# Altium footprint library AltiumDesignerLibraries.PcbLib: 313 footprints (part 7 of 20)
Each footprint in its own frame and in the unit in brackets; x right, y up, seen from the top. Pads: shape width x height; smd on the part's side, far side on the other; paste and mask are expansions set on the pad; w line width, h text height; cw(c..) or ccw(c..) is an arc to the next point about the centre after c.
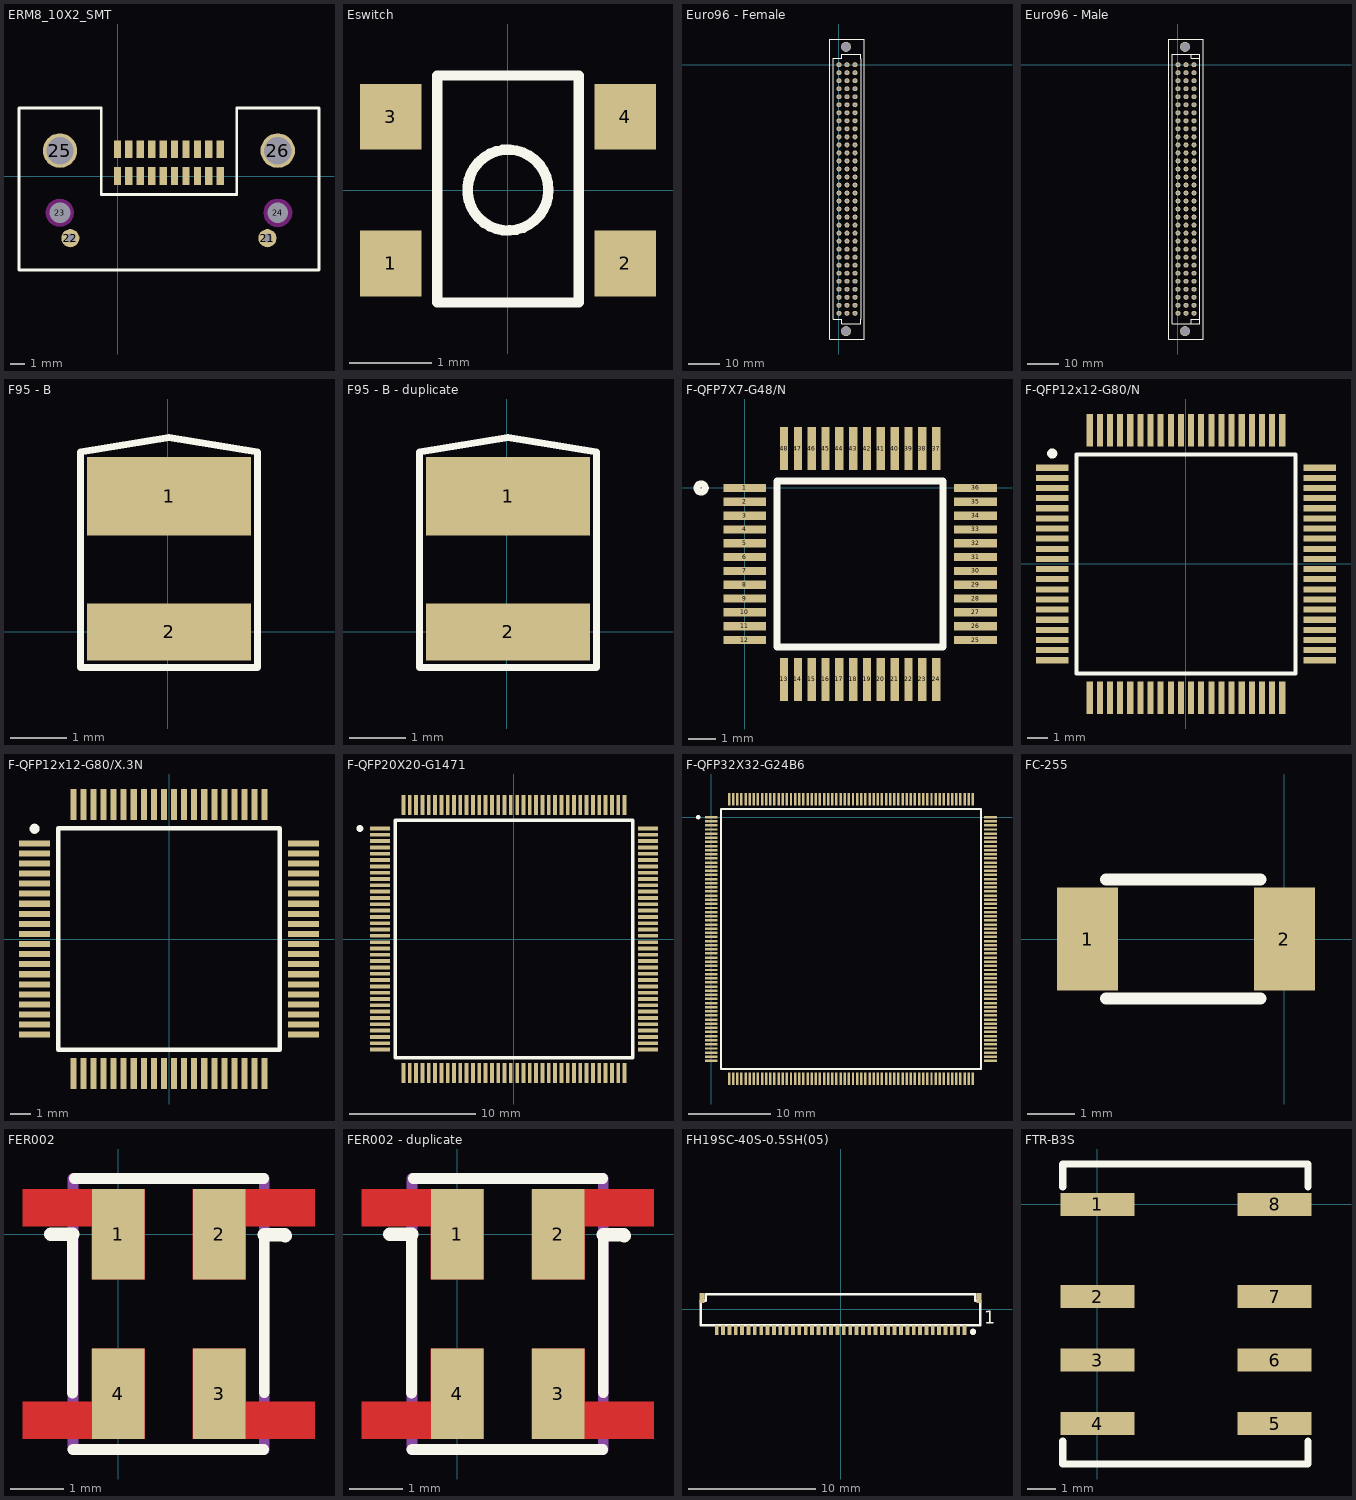
[diagram p6: the footprints below, top view; thin cyan lines are the x and y axes]

## ERM8_10X2_SMT [mil]
height 196.85
pads (26):
  rect 20x49 smd mask+3: 1(-0.99,0) 2(-0.99,74.02) 3(30.5,0) 4(30.5,74.02) 5(62,0) 6(62,74.02) 7(93.5,0) 8(93.5,74.02) 9(124.99,0) 10(124.99,74.02) 11(156.49,0) 12(156.49,74.02) 13(187.98,0) 14(187.98,74.02) 15(219.48,0) 16(219.48,74.02) 17(250.98,0) 18(250.98,74.02) 19(282.47,0) 20(282.47,74.02)
  round 50 hole 25 mask+3: 21(412.39,-171.46) 22(-130.91,-171.46)
  round 35 hole 57 unplated mask+15: 23(-159.46,-101.38) 24(440.94,-101.38)
  round 95 hole 75 mask+3: 25(-159.46,69.88) 26(440.94,69.88)
Top Overlay:
  lines w8: -272.45,-259.25 554.72,-259.25 554.72,187.6 327.94,187.6 327.94,-50.59 -45.68,-50.59 -45.68,187.6 -272.45,187.6 -272.45,-259.25
Keep-Out Layer:
  pour cut-out: 401.8,-101.44 403.14,-111.62 407.07,-121.11 413.32,-129.26 421.47,-135.51 430.95,-139.44 441.13,-140.78 451.31,-139.44 460.8,-135.51 468.95,-129.26 475.2,-121.11 479.13,-111.62 480.47,-101.44 479.13,-91.26 475.2,-81.77 468.95,-73.63 460.8,-67.37 451.31,-63.44 441.13,-62.1 430.95,-63.44 421.47,-67.37 413.32,-73.63 407.07,-81.77 403.14,-91.26
  pour cut-out: -198.21,-101.44 -196.9,-111.36 -193.07,-120.61 -186.98,-128.55 -179.04,-134.65 -169.79,-138.48 -159.87,-139.78 -149.94,-138.48 -140.7,-134.65 -132.75,-128.55 -126.66,-120.61 -122.83,-111.36 -121.53,-101.44 -122.83,-91.52 -126.66,-82.27 -132.75,-74.33 -140.7,-68.24 -149.94,-64.41 -159.87,-63.1 -169.79,-64.41 -179.04,-68.24 -186.98,-74.33 -193.07,-82.27 -196.9,-91.52

## Eswitch [mil]
height 62
pads (4):
  rect 29.5x31.5 smd: 1(-56.25,-35.25) 2(56.25,-35.25) 3(-56.25,35.25) 4(56.25,35.25)
Top Overlay:
  circle w5: c0,0 r19.42
  lines w5: -34,-54 -34,55 34,55 34,-54 -34,-54

## Euro96 - Female [mil]
pads (98):
  round 62 hole 38: A1(200,0) A2(200,-100) A3(200,-200) A4(200,-300) A5(200,-400) A6(200,-500) A7(200,-600) A8(200,-700) A9(200,-800) A10(200,-900) A11(200,-1000) A12(200,-1100) A13(200,-1200) A14(200,-1300) A15(200,-1400) A16(200,-1500) A17(200,-1600) A18(200,-1700) A19(200,-1800) A20(200,-1900) A21(200,-2000) A22(200,-2100) A23(200,-2200) A24(200,-2300) A25(200,-2400) A26(200,-2500) A27(200,-2600) A28(200,-2700) A29(200,-2800) A30(200,-2900) A31(200,-3000) A32(200,-3100) B1(100,0) B2(100,-100) B3(100,-200) B4(100,-300) B5(100,-400) B6(100,-500) B7(100,-600) B8(100,-700) B9(100,-800) B10(100,-900) B11(100,-1000) B12(100,-1100) B13(100,-1200) B14(100,-1300) B15(100,-1400) B16(100,-1500) B17(100,-1600) B18(100,-1700) B19(100,-1800) B20(100,-1900) B21(100,-2000) B22(100,-2100) B23(100,-2200) B24(100,-2300) B25(100,-2400) B26(100,-2500) B27(100,-2600) B28(100,-2700) B29(100,-2800) B30(100,-2900) B31(100,-3000) B32(100,-3100) C1(0,0) C2(0,-100) C3(0,-200) C4(0,-300) C5(0,-400) C6(0,-500) C7(0,-600) C8(0,-700) C9(0,-800) C10(0,-900) C11(0,-1000) C12(0,-1100) C13(0,-1200) C14(0,-1300) C15(0,-1400) C16(0,-1500) C17(0,-1600) C18(0,-1700) C19(0,-1800) C20(0,-1900) C21(0,-2000) C22(0,-2100) C23(0,-2200) C24(0,-2300) C25(0,-2400) C26(0,-2500) C27(0,-2600) C28(0,-2700) C29(0,-2800) C30(0,-2900) C31(0,-3000) C32(0,-3100)
  round 125 hole 110: ""(88,-3322) ""(88,222)
Top Overlay:
  lines w10: -72.54,-3172.47 32.46,-3172.47 ; -72,-3172.47 -72,77 33,77 33,128 33.94,128.94 166.34,128.94 271.34,128.94 271.65,128.62 271.65,76.77 272,-3173 272,-3228.98 ; 32.48,-3173.23 32.48,-3230.23 33.71,-3229 166,-3229 216,-3229 ; 213.58,-3229 271.98,-3229 ; 271.98,-3229 272,-3228.98 ; -118,-3420 -118,320 318,320 318,-3420 -118,-3420

## Euro96 - Male [mil]
pads (98):
  round 62 hole 39: A1(0,0) A2(0,-100) A3(0,-200) A4(0,-300) A5(0,-400) A6(0,-500) A7(0,-600) A8(0,-700) A9(0,-800) A10(0,-900) A11(0,-1000) A12(0,-1100) A13(0,-1200) A14(0,-1300) A15(0,-1400) A16(0,-1500) A17(0,-1600) A18(0,-1700) A19(0,-1800) A20(0,-1900) A21(0,-2000) A22(0,-2100) A23(0,-2200) A24(0,-2300) A25(0,-2400) A26(0,-2500) A27(0,-2600) A28(0,-2700) A29(0,-2800) A30(0,-2900) A31(0,-3000) A32(0,-3100) B1(100,0) B2(100,-100) B3(100,-200) B4(100,-300) B5(100,-400) B6(100,-500) B7(100,-600) B8(100,-700) B9(100,-800) B10(100,-900) B11(100,-1000) B12(100,-1100) B13(100,-1200) B14(100,-1300) B15(100,-1400) B16(100,-1500) B17(100,-1600) B18(100,-1700) B19(100,-1800) B20(100,-1900) B21(100,-2000) B22(100,-2100) B23(100,-2200) B24(100,-2300) B25(100,-2400) B26(100,-2500) B27(100,-2600) B28(100,-2700) B29(100,-2800) B30(100,-2900) B31(100,-3000) B32(100,-3100) C1(200,0) C2(200,-100) C3(200,-200) C4(200,-300) C5(200,-400) C6(200,-500) C7(200,-600) C8(200,-700) C9(200,-800) C10(200,-900) C11(200,-1000) C12(200,-1100) C13(200,-1200) C14(200,-1300) C15(200,-1400) C16(200,-1500) C17(200,-1600) C18(200,-1700) C19(200,-1800) C20(200,-1900) C21(200,-2000) C22(200,-2100) C23(200,-2200) C24(200,-2300) C25(200,-2400) C26(200,-2500) C27(200,-2600) C28(200,-2700) C29(200,-2800) C30(200,-2900) C31(200,-3000) C32(200,-3100)
  round 125 hole 110: ""(88,-3322) ""(88,222)
Top Overlay:
  lines w10: -73,-3229 -73,129 271,129 ; -72,-3229 272,-3229 272,129 ; 166,-3229 166,-3172 167,-3173 272,-3173 ; 166,129 166,78 167,77 272,77 ; -118,-3420 -118,320 318,320 318,-3420 -118,-3420

## F95 - B [mil] "Frameless Capacitor"
pads (2):
  rect 115x55 smd: 1(1,95)
  rect 115x40 smd: 2(1,0)
Top Overlay:
  lines w5: -61,-25 -61,126 1,136 63,126 63,-25 -61,-25

## F95 - B - duplicate [mil] "Frameless Capacitor"
pads (2):
  rect 115x55 smd: 1(1,95)
  rect 115x40 smd: 2(1,0)
Top Overlay:
  lines w5: -61,-25 -61,126 1,136 63,126 63,-25 -61,-25

## F-QFP7X7-G48/N [mm]
pads (48):
  rect 1.55x0.3 smd: 1(0,0) 2(0,-0.5) 3(0,-1) 4(0,-1.5) 5(0,-2) 6(0,-2.5) 7(0,-3) 8(0,-3.5) 9(0,-4) 10(0,-4.5) 11(0,-5) 12(0,-5.5) 25(8.35,-5.5) 26(8.35,-5) 27(8.35,-4.5) 28(8.35,-4) 29(8.35,-3.5) 30(8.35,-3) 31(8.35,-2.5) 32(8.35,-2) 33(8.35,-1.5) 34(8.35,-1) 35(8.35,-0.5) 36(8.35,0)
  rect 0.3x1.55 smd: 13(1.425,-6.925) 14(1.925,-6.925) 15(2.425,-6.925) 16(2.925,-6.925) 17(3.425,-6.925) 18(3.925,-6.925) 19(4.425,-6.925) 20(4.925,-6.925) 21(5.425,-6.925) 22(5.925,-6.925) 23(6.425,-6.925) 24(6.925,-6.925) 37(6.925,1.425) 38(6.425,1.425) 39(5.925,1.425) 40(5.425,1.425) 41(4.925,1.425) 42(4.425,1.425) 43(3.925,1.425) 44(3.425,1.425) 45(2.925,1.425) 46(2.425,1.425) 47(1.925,1.425) 48(1.425,1.425)
Top Overlay:
  circle w0.25: c-1.575,0 r0.15
  lines w0.25: 1.175,-5.75 7.175,-5.75 7.175,0.25 1.175,0.25 1.175,-5.75

## F-QFP12x12-G80/N [mm]
pads (80):
  rect 1.6x0.3 smd: 1(-6.6,4.75) 2(-6.6,4.25) 3(-6.6,3.75) 4(-6.6,3.25) 5(-6.6,2.75) 6(-6.6,2.25) 7(-6.6,1.75) 8(-6.6,1.25) 9(-6.6,0.75) 10(-6.6,0.25) 11(-6.6,-0.25) 12(-6.6,-0.75) 13(-6.6,-1.25) 14(-6.6,-1.75) 15(-6.6,-2.25) 16(-6.6,-2.75) 17(-6.6,-3.25) 18(-6.6,-3.75) 19(-6.6,-4.25) 20(-6.6,-4.75) 41(6.6,-4.75) 42(6.6,-4.25) 43(6.6,-3.75) 44(6.6,-3.25) 45(6.6,-2.75) 46(6.6,-2.25) 47(6.6,-1.75) 48(6.6,-1.25) 49(6.6,-0.75) 50(6.6,-0.25) 51(6.6,0.25) 52(6.6,0.75) 53(6.6,1.25) 54(6.6,1.75) 55(6.6,2.25) 56(6.6,2.75) 57(6.6,3.25) 58(6.6,3.75) 59(6.6,4.25) 60(6.6,4.75)
  rect 0.3x1.6 smd: 21(-4.75,-6.6) 22(-4.25,-6.6) 23(-3.75,-6.6) 24(-3.25,-6.6) 25(-2.75,-6.6) 26(-2.25,-6.6) 27(-1.75,-6.6) 28(-1.25,-6.6) 29(-0.75,-6.6) 30(-0.25,-6.6) 31(0.25,-6.6) 32(0.75,-6.6) 33(1.25,-6.6) 34(1.75,-6.6) 35(2.25,-6.6) 36(2.75,-6.6) 37(3.25,-6.6) 38(3.75,-6.6) 39(4.25,-6.6) 40(4.75,-6.6) 61(4.75,6.6) 62(4.25,6.6) 63(3.75,6.6) 64(3.25,6.6) 65(2.75,6.6) 66(2.25,6.6) 67(1.75,6.6) 68(1.25,6.6) 69(0.75,6.6) 70(0.25,6.6) 71(-0.25,6.6) 72(-0.75,6.6) 73(-1.25,6.6) 74(-1.75,6.6) 75(-2.25,6.6) 76(-2.75,6.6) 77(-3.25,6.6) 78(-3.75,6.6) 79(-4.25,6.6) 80(-4.75,6.6)
Top Overlay:
  circle w0.25: c-6.6,5.45 r0.125
  lines w0.2: -5.4,-5.4 -5.4,5.4 5.4,5.4 5.4,-5.4 -5.4,-5.4

## F-QFP12x12-G80/X.3N [mm]
pads (80):
  rect 1.55x0.3 smd: 1(-6.675,4.75) 2(-6.675,4.25) 3(-6.675,3.75) 4(-6.675,3.25) 5(-6.675,2.75) 6(-6.675,2.25) 7(-6.675,1.75) 8(-6.675,1.25) 9(-6.675,0.75) 10(-6.675,0.25) 11(-6.675,-0.25) 12(-6.675,-0.75) 13(-6.675,-1.25) 14(-6.675,-1.75) 15(-6.675,-2.25) 16(-6.675,-2.75) 17(-6.675,-3.25) 18(-6.675,-3.75) 19(-6.675,-4.25) 20(-6.675,-4.75) 41(6.675,-4.75) 42(6.675,-4.25) 43(6.675,-3.75) 44(6.675,-3.25) 45(6.675,-2.75) 46(6.675,-2.25) 47(6.675,-1.75) 48(6.675,-1.25) 49(6.675,-0.75) 50(6.675,-0.25) 51(6.675,0.25) 52(6.675,0.75) 53(6.675,1.25) 54(6.675,1.75) 55(6.675,2.25) 56(6.675,2.75) 57(6.675,3.25) 58(6.675,3.75) 59(6.675,4.25) 60(6.675,4.75)
  rect 0.3x1.55 smd: 21(-4.75,-6.675) 22(-4.25,-6.675) 23(-3.75,-6.675) 24(-3.25,-6.675) 25(-2.75,-6.675) 26(-2.25,-6.675) 27(-1.75,-6.675) 28(-1.25,-6.675) 29(-0.75,-6.675) 30(-0.25,-6.675) 31(0.25,-6.675) 32(0.75,-6.675) 33(1.25,-6.675) 34(1.75,-6.675) 35(2.25,-6.675) 36(2.75,-6.675) 37(3.25,-6.675) 38(3.75,-6.675) 39(4.25,-6.675) 40(4.75,-6.675) 61(4.75,6.675) 62(4.25,6.675) 63(3.75,6.675) 64(3.25,6.675) 65(2.75,6.675) 66(2.25,6.675) 67(1.75,6.675) 68(1.25,6.675) 69(0.75,6.675) 70(0.25,6.675) 71(-0.25,6.675) 72(-0.75,6.675) 73(-1.25,6.675) 74(-1.75,6.675) 75(-2.25,6.675) 76(-2.75,6.675) 77(-3.25,6.675) 78(-3.75,6.675) 79(-4.25,6.675) 80(-4.75,6.675)
Top Overlay:
  circle w0.25: c-6.675,5.475 r0.125
  lines w0.2: -5.5,-5.5 -5.5,5.5 5.5,5.5 5.5,-5.5 -5.5,-5.5

## F-QFP20X20-G1471 [mm]
pads (144):
  rect 0.3x1.6 smd: 1(8.75,10.6) 2(8.25,10.6) 3(7.75,10.6) 4(7.25,10.6) 5(6.75,10.6) 6(6.25,10.6) 7(5.75,10.6) 8(5.25,10.6) 9(4.75,10.6) 10(4.25,10.6) 11(3.75,10.6) 12(3.25,10.6) 13(2.75,10.6) 14(2.25,10.6) 15(1.75,10.6) 16(1.25,10.6) 17(0.75,10.6) 18(0.25,10.6) 19(-0.25,10.6) 20(-0.75,10.6) 21(-1.25,10.6) 22(-1.75,10.6) 23(-2.25,10.6) 24(-2.75,10.6) 25(-3.25,10.6) 26(-3.75,10.6) 27(-4.25,10.6) 28(-4.75,10.6) 29(-5.25,10.6) 30(-5.75,10.6) 31(-6.25,10.6) 32(-6.75,10.6) 33(-7.25,10.6) 34(-7.75,10.6) 35(-8.25,10.6) 36(-8.75,10.6) 73(8.75,-10.6) 74(8.25,-10.6) 75(7.75,-10.6) 76(7.25,-10.6) 77(6.75,-10.6) 78(6.25,-10.6) 79(5.75,-10.6) 80(5.25,-10.6) 81(4.75,-10.6) 82(4.25,-10.6) 83(3.75,-10.6) 84(3.25,-10.6) 85(2.75,-10.6) 86(2.25,-10.6) 87(1.75,-10.6) 88(1.25,-10.6) 89(0.75,-10.6) 90(0.25,-10.6) 91(-0.25,-10.6) 92(-0.75,-10.6) 93(-1.25,-10.6) 94(-1.75,-10.6) 95(-2.25,-10.6) 96(-2.75,-10.6) 97(-3.25,-10.6) 98(-3.75,-10.6) 99(-4.25,-10.6) 100(-4.75,-10.6) 101(-5.25,-10.6) 102(-5.75,-10.6) 103(-6.25,-10.6) 104(-6.75,-10.6) 105(-7.25,-10.6) 106(-7.75,-10.6) 107(-8.25,-10.6) 108(-8.75,-10.6)
  rect 1.6x0.3 smd: 37(10.6,-8.75) 38(10.6,-8.25) 39(10.6,-7.75) 40(10.6,-7.25) 41(10.6,-6.75) 42(10.6,-6.25) 43(10.6,-5.75) 44(10.6,-5.25) 45(10.6,-4.75) 46(10.6,-4.25) 47(10.6,-3.75) 48(10.6,-3.25) 49(10.6,-2.75) 50(10.6,-2.25) 51(10.6,-1.75) 52(10.6,-1.25) 53(10.6,-0.75) 54(10.6,-0.25) 55(10.6,0.25) 56(10.6,0.75) 57(10.6,1.25) 58(10.6,1.75) 59(10.6,2.25) 60(10.6,2.75) 61(10.6,3.25) 62(10.6,3.75) 63(10.6,4.25) 64(10.6,4.75) 65(10.6,5.25) 66(10.6,5.75) 67(10.6,6.25) 68(10.6,6.75) 69(10.6,7.25) 70(10.6,7.75) 71(10.6,8.25) 72(10.6,8.75) 109(-10.6,-8.75) 110(-10.6,-8.25) 111(-10.6,-7.75) 112(-10.6,-7.25) 113(-10.6,-6.75) 114(-10.6,-6.25) 115(-10.6,-5.75) 116(-10.6,-5.25) 117(-10.6,-4.75) 118(-10.6,-4.25) 119(-10.6,-3.75) 120(-10.6,-3.25) 121(-10.6,-2.75) 122(-10.6,-2.25) 123(-10.6,-1.75) 124(-10.6,-1.25) 125(-10.6,-0.75) 126(-10.6,-0.25) 127(-10.6,0.25) 128(-10.6,0.75) 129(-10.6,1.25) 130(-10.6,1.75) 131(-10.6,2.25) 132(-10.6,2.75) 133(-10.6,3.25) 134(-10.6,3.75) 135(-10.6,4.25) 136(-10.6,4.75) 137(-10.6,5.25) 138(-10.6,5.75) 139(-10.6,6.25) 140(-10.6,6.75) 141(-10.6,7.25) 142(-10.6,7.75) 143(-10.6,8.25) 144(-10.6,8.75)
Top Overlay:
  circle w0.25: c-12.2,8.75 r0.15
  lines w0.25: -9.4,-9.4 9.4,-9.4 9.4,9.4 -9.4,9.4 -9.4,-9.4

## F-QFP32X32-G24B6 [mm]
pads (240):
  rect 1.55x0.3 smd: 1(0,0) 2(0,-0.5) 3(0,-1) 4(0,-1.5) 5(0,-2) 6(0,-2.5) 7(0,-3) 8(0,-3.5) 9(0,-4) 10(0,-4.5) 11(0,-5) 12(0,-5.5) 13(0,-6) 14(0,-6.5) 15(0,-7) 16(0,-7.5) 17(0,-8) 18(0,-8.5) 19(0,-9) 20(0,-9.5) 21(0,-10) 22(0,-10.5) 23(0,-11) 24(0,-11.5) 25(0,-12) 26(0,-12.5) 27(0,-13) 28(0,-13.5) 29(0,-14) 30(0,-14.5) 31(0,-15) 32(0,-15.5) 33(0,-16) 34(0,-16.5) 35(0,-17) 36(0,-17.5) 37(0,-18) 38(0,-18.5) 39(0,-19) 40(0,-19.5) 41(0,-20) 42(0,-20.5) 43(0,-21) 44(0,-21.5) 45(0,-22) 46(0,-22.5) 47(0,-23) 48(0,-23.5) 49(0,-24) 50(0,-24.5) 51(0,-25) 52(0,-25.5) 53(0,-26) 54(0,-26.5) 55(0,-27) 56(0,-27.5) 57(0,-28) 58(0,-28.5) 59(0,-29) 60(0,-29.5) 121(33.8,-29.5) 122(33.8,-29) 123(33.8,-28.5) 124(33.8,-28) 125(33.8,-27.5) 126(33.8,-27) 127(33.8,-26.5) 128(33.8,-26) 129(33.8,-25.5) 130(33.8,-25) 131(33.8,-24.5) 132(33.8,-24) 133(33.8,-23.5) 134(33.8,-23) 135(33.8,-22.5) 136(33.8,-22) 137(33.8,-21.5) 138(33.8,-21) 139(33.8,-20.5) 140(33.8,-20) 141(33.8,-19.5) 142(33.8,-19) 143(33.8,-18.5) 144(33.8,-18) 145(33.8,-17.5) 146(33.8,-17) 147(33.8,-16.5) 148(33.8,-16) 149(33.8,-15.5) 150(33.8,-15) 151(33.8,-14.5) 152(33.8,-14) 153(33.8,-13.5) 154(33.8,-13) 155(33.8,-12.5) 156(33.8,-12) 157(33.8,-11.5) 158(33.8,-11) 159(33.8,-10.5) 160(33.8,-10) 161(33.8,-9.5) 162(33.8,-9) 163(33.8,-8.5) 164(33.8,-8) 165(33.8,-7.5) 166(33.8,-7) 167(33.8,-6.5) 168(33.8,-6) 169(33.8,-5.5) 170(33.8,-5) 171(33.8,-4.5) 172(33.8,-4) 173(33.8,-3.5) 174(33.8,-3) 175(33.8,-2.5) 176(33.8,-2) 177(33.8,-1.5) 178(33.8,-1) 179(33.8,-0.5) 180(33.8,0)
  rect 0.3x1.55 smd: 61(2.15,-31.65) 62(2.65,-31.65) 63(3.15,-31.65) 64(3.65,-31.65) 65(4.15,-31.65) 66(4.65,-31.65) 67(5.15,-31.65) 68(5.65,-31.65) 69(6.15,-31.65) 70(6.65,-31.65) 71(7.15,-31.65) 72(7.65,-31.65) 73(8.15,-31.65) 74(8.65,-31.65) 75(9.15,-31.65) 76(9.65,-31.65) 77(10.15,-31.65) 78(10.65,-31.65) 79(11.15,-31.65) 80(11.65,-31.65) 81(12.15,-31.65) 82(12.65,-31.65) 83(13.15,-31.65) 84(13.65,-31.65) 85(14.15,-31.65) 86(14.65,-31.65) 87(15.15,-31.65) 88(15.65,-31.65) 89(16.15,-31.65) 90(16.65,-31.65) 91(17.15,-31.65) 92(17.65,-31.65) 93(18.15,-31.65) 94(18.65,-31.65) 95(19.15,-31.65) 96(19.65,-31.65) 97(20.15,-31.65) 98(20.65,-31.65) 99(21.15,-31.65) 100(21.65,-31.65) 101(22.15,-31.65) 102(22.65,-31.65) 103(23.15,-31.65) 104(23.65,-31.65) 105(24.15,-31.65) 106(24.65,-31.65) 107(25.15,-31.65) 108(25.65,-31.65) 109(26.15,-31.65) 110(26.65,-31.65) 111(27.15,-31.65) 112(27.65,-31.65) 113(28.15,-31.65) 114(28.65,-31.65) 115(29.15,-31.65) 116(29.65,-31.65) 117(30.15,-31.65) 118(30.65,-31.65) 119(31.15,-31.65) 120(31.65,-31.65) 181(31.65,2.15) 182(31.15,2.15) 183(30.65,2.15) 184(30.15,2.15) 185(29.65,2.15) 186(29.15,2.15) 187(28.65,2.15) 188(28.15,2.15) 189(27.65,2.15) 190(27.15,2.15) 191(26.65,2.15) 192(26.15,2.15) 193(25.65,2.15) 194(25.15,2.15) 195(24.65,2.15) 196(24.15,2.15) 197(23.65,2.15) 198(23.15,2.15) 199(22.65,2.15) 200(22.15,2.15) 201(21.65,2.15) 202(21.15,2.15) 203(20.65,2.15) 204(20.15,2.15) 205(19.65,2.15) 206(19.15,2.15) 207(18.65,2.15) 208(18.15,2.15) 209(17.65,2.15) 210(17.15,2.15) 211(16.65,2.15) 212(16.15,2.15) 213(15.65,2.15) 214(15.15,2.15) 215(14.65,2.15) 216(14.15,2.15) 217(13.65,2.15) 218(13.15,2.15) 219(12.65,2.15) 220(12.15,2.15) 221(11.65,2.15) 222(11.15,2.15) 223(10.65,2.15) 224(10.15,2.15) 225(9.65,2.15) 226(9.15,2.15) 227(8.65,2.15) 228(8.15,2.15) 229(7.65,2.15) 230(7.15,2.15) 231(6.65,2.15) 232(6.15,2.15) 233(5.65,2.15) 234(5.15,2.15) 235(4.65,2.15) 236(4.15,2.15) 237(3.65,2.15) 238(3.15,2.15) 239(2.65,2.15) 240(2.15,2.15)
Top Overlay:
  circle w0.25: c-1.575,0 r0.15
  lines w0.25: 1.175,-30.475 32.625,-30.475 32.625,0.975 1.175,0.975 1.175,-30.475

## FC-255 [mm] "FC-255 crystal footprint"
pads (2):
  rect 1.3x2.2 smd: 1(-4.2,0) 2(0,0)
Top Overlay:
  lines w0.254: -3.81,-1.27 -0.508,-1.27 ; -3.81,1.27 -0.508,1.27

## FER002 [mil] "2020 (5050 metric)"
height 177.17
pads (4):
  rect 39x67 smd mask+3: 1(0,0) 2(74.8,0) 3(74.8,-118.11) 4(0,-118.11)
Top Layer:
  region: 19.69,33.46 -70.87,33.46 -70.87,5.91 -19.68,5.91 -19.68,-33.46 19.69,-33.46
  region: 145.67,33.46 55.12,33.46 55.12,-33.46 94.49,-33.46 94.49,5.91 145.67,5.91
  region: 145.67,-124.02 94.49,-124.02 94.49,-84.65 55.12,-84.65 55.12,-151.57 145.67,-151.57
  region: 19.69,-84.65 -19.68,-84.65 -19.68,-124.02 -70.87,-124.02 -70.87,-151.57 19.69,-151.57
Top Overlay:
  lines w8: -33.86,-117.72 -33.86,0.79 ; -33.46,-159.45 107.87,-159.45 ; -32.68,41.34 107.87,41.34 ; 108.27,-117.32 108.27,-0.39
  lines w10: -50.2,0 -33.86,0 ; 108.27,-0.39 123.43,-0.39 124.02,-0.98
Top Solder:
  region: -11.1,36.44 -73.6,36.44 -73.6,2.94 -11.1,2.94
  region: 148.4,36.44 85.9,36.44 85.9,2.94 148.4,2.94
  region: 148.9,-121.06 86.4,-121.06 86.4,-154.56 148.9,-154.56
  region: -11.1,-121.06 -73.6,-121.06 -73.6,-154.56 -11.1,-154.56
Mechanical 2:
  lines w8: -33.46,-159.45 -33.46,41.34 108.27,41.34 108.27,-159.45 -33.46,-159.45

## FER002 - duplicate [mil] "2020 (5050 metric)"
height 177.17
pads (4):
  rect 39x67 smd mask+3: 1(0,0) 2(74.8,0) 3(74.8,-118.11) 4(0,-118.11)
Top Layer:
  region: 19.69,-84.65 -19.68,-84.65 -19.68,-124.02 -70.87,-124.02 -70.87,-151.57 19.69,-151.57
  region: 145.67,-124.02 94.49,-124.02 94.49,-84.65 55.12,-84.65 55.12,-151.57 145.67,-151.57
  region: 145.67,33.46 55.12,33.46 55.12,-33.46 94.49,-33.46 94.49,5.91 145.67,5.91
  region: 19.69,33.46 -70.87,33.46 -70.87,5.91 -19.68,5.91 -19.68,-33.46 19.69,-33.46
Top Overlay:
  lines w8: -33.86,-117.72 -33.86,0.79 ; -33.46,-159.45 107.87,-159.45 ; -32.68,41.34 107.87,41.34 ; 108.27,-117.32 108.27,-0.39
  lines w10: -50.2,0 -33.86,0 ; 108.27,-0.39 123.43,-0.39 124.02,-0.98
Top Solder:
  region: -11.1,-121.06 -73.6,-121.06 -73.6,-154.56 -11.1,-154.56
  region: 148.9,-121.06 86.4,-121.06 86.4,-154.56 148.9,-154.56
  region: 148.4,36.44 85.9,36.44 85.9,2.94 148.4,2.94
  region: -11.1,36.44 -73.6,36.44 -73.6,2.94 -11.1,2.94
Mechanical 2:
  lines w8: -33.46,-159.45 108.27,-159.45 108.27,41.34 -33.46,41.34 -33.46,-159.45

## FH19SC-40S-0.5SH(05) [mm]
pads (42):
  rect 0.3x0.8 smd: 1(9.75,-1.625) 2(9.25,-1.625) 3(8.75,-1.625) 4(8.25,-1.625) 5(7.75,-1.625) 6(7.25,-1.625) 7(6.75,-1.625) 8(6.25,-1.625) 9(5.75,-1.625) 10(5.25,-1.625) 11(4.75,-1.625) 12(4.25,-1.625) 13(3.75,-1.625) 14(3.25,-1.625) 15(2.75,-1.625) 16(2.25,-1.625) 17(1.75,-1.625) 18(1.25,-1.625) 19(0.75,-1.625) 20(0.25,-1.625) 21(-0.25,-1.625) 22(-0.75,-1.625) 23(-1.25,-1.625) 24(-1.75,-1.625) 25(-2.25,-1.625) 26(-2.75,-1.625) 27(-3.25,-1.625) 28(-3.75,-1.625) 29(-4.25,-1.625) 30(-4.75,-1.625) 31(-5.25,-1.625) 32(-5.75,-1.625) 33(-6.25,-1.625) 34(-6.75,-1.625) 35(-7.25,-1.625) 36(-7.75,-1.625) 37(-8.25,-1.625) 38(-8.75,-1.625) 39(-9.25,-1.625) 40(-9.75,-1.625)
  rect 0.4x0.8 smd: 41(10.9,0.875) 42(-10.9,0.875)
Top Overlay:
  circle w0.25: c10.416,-1.778 r0.125
  lines w0.2: -11,-1.25 11,-1.25 11,0.663 10.995,0.658 10.6,0.658 10.599,0.659 10.599,1.174 -10.6,1.174 -10.6,0.673 -11,0.673 -11,-1.25
  text "1" at 11.303,-1.143 h1

## FTR-B3S [mm]
pads (8):
  rect 2.56x0.8 smd: 1(0,0) 2(0,-3.2) 3(0,-5.4) 4(0,-7.6) 5(6.14,-7.6) 6(6.14,-5.4) 7(6.14,-3.2) 8(6.14,0)
Top Overlay:
  lines w0.254: -1.2,-8.2 -1.2,-9 7.3,-9 7.3,-8.2 ; -1.2,0.6 -1.2,1.4 7.3,1.4 7.3,0.6